# Altium footprint library con-samtec.PCBLIB: 805 footprints (part 47 of 55)
Each footprint in its own frame and in the unit in brackets; x right, y up, seen from the top. Pads: shape width x height; smd on the part's side, far side on the other; paste and mask are expansions set on the pad; w line width, h text height; cw(c..) or ccw(c..) is an arc to the next point about the centre after c.
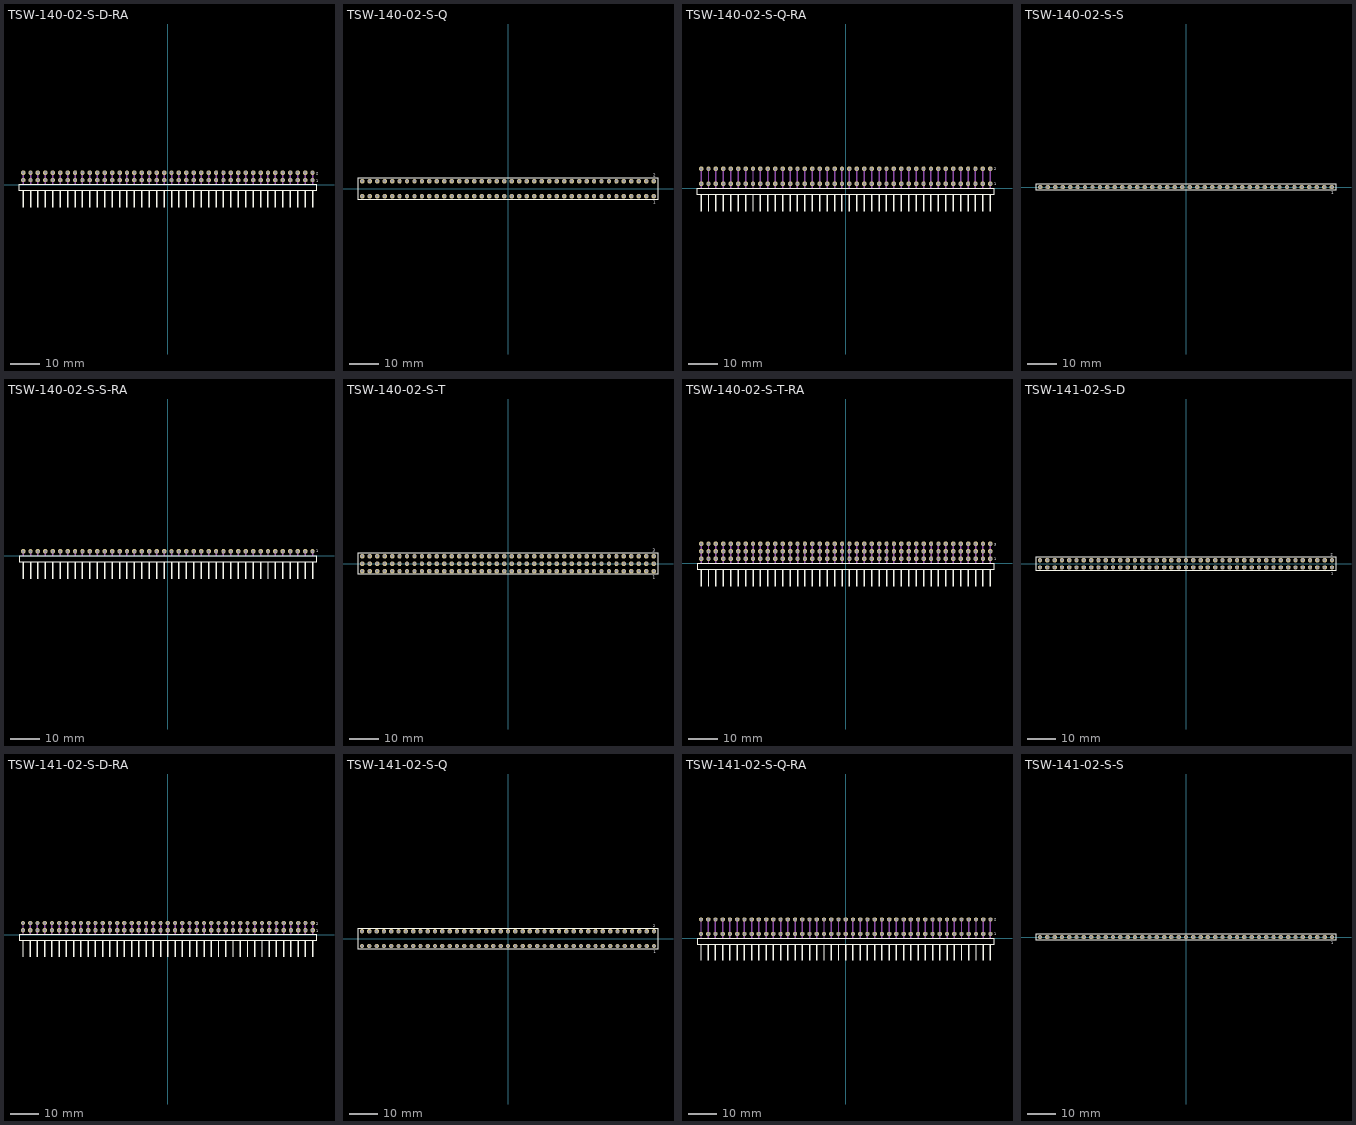
[diagram p46: the footprints below, top view; thin cyan lines are the x and y axes]

## TSW-140-02-S-D-RA [mil]
pads (80):
  oct 59.06x59.06 hole 39.37: 1(1950,60) 2(1950,160) 3(1850,60) 4(1850,160) 5(1750,60) 6(1750,160) 7(1650,60) 8(1650,160) 9(1550,60) 10(1550,160) 11(1450,60) 12(1450,160) 13(1350,60) 14(1350,160) 15(1250,60) 16(1250,160) 17(1150,60) 18(1150,160) 19(1050,60) 20(1050,160) 21(950,60) 22(950,160) 23(850,60) 24(850,160) 25(750,60) 26(750,160) 27(650,60) 28(650,160) 29(550,60) 30(550,160) 31(450,60) 32(450,160) 33(350,60) 34(350,160) 35(250,60) 36(250,160) 37(150,60) 38(150,160) 39(50,60) 40(50,160) 41(-50,60) 42(-50,160) 43(-150,60) 44(-150,160) 45(-250,60) 46(-250,160) 47(-350,60) 48(-350,160) 49(-450,60) 50(-450,160) 51(-550,60) 52(-550,160) 53(-650,60) 54(-650,160) 55(-750,60) 56(-750,160) 57(-850,60) 58(-850,160) 59(-950,60) 60(-950,160) 61(-1050,60) 62(-1050,160) 63(-1150,60) 64(-1150,160) 65(-1250,60) 66(-1250,160) 67(-1350,60) 68(-1350,160) 69(-1450,60) 70(-1450,160) 71(-1550,60) 72(-1550,160) 73(-1650,60) 74(-1650,160) 75(-1750,60) 76(-1750,160) 77(-1850,60) 78(-1850,160) 79(-1950,60) 80(-1950,160)
Top Overlay:
  rectangle: -1960,-310.63 -1940,-80.32
  rectangle: -1860,-310.63 -1840,-80.32
  rectangle: -1760,-310.63 -1740,-80.32
  rectangle: -1660,-310.63 -1640,-80.32
  rectangle: -1560,-310.63 -1540,-80.32
  rectangle: -1460,-310.63 -1440,-80.32
  rectangle: -1360,-310.63 -1340,-80.32
  rectangle: -1260,-310.63 -1240,-80.32
  rectangle: -1160,-310.63 -1140,-80.32
  rectangle: -1060,-310.63 -1040,-80.32
  rectangle: -960,-310.63 -940,-80.32
  rectangle: -860,-310.63 -840,-80.32
  rectangle: -760,-310.63 -740,-80.32
  rectangle: -660,-310.63 -640,-80.32
  rectangle: -560,-310.63 -540,-80.32
  rectangle: -460,-310.63 -440,-80.32
  rectangle: -360,-310.63 -340,-80.32
  rectangle: -260,-310.63 -240,-80.32
  rectangle: -160,-310.63 -140,-80.32
  rectangle: -60,-310.63 -40,-80.32
  rectangle: 40,-310.63 60,-80.32
  rectangle: 140,-310.63 160,-80.32
  rectangle: 240,-310.63 260,-80.32
  rectangle: 340,-310.63 360,-80.32
  rectangle: 440,-310.63 460,-80.32
  rectangle: 540,-310.63 560,-80.32
  rectangle: 640,-310.63 660,-80.32
  rectangle: 740,-310.63 760,-80.32
  rectangle: 840,-310.63 860,-80.32
  rectangle: 940,-310.63 960,-80.32
  rectangle: 1040,-310.63 1060,-80.32
  rectangle: 1140,-310.63 1160,-80.32
  rectangle: 1240,-310.63 1260,-80.32
  rectangle: 1340,-310.63 1360,-80.32
  rectangle: 1440,-310.63 1460,-80.32
  rectangle: 1540,-310.63 1560,-80.32
  rectangle: 1640,-310.63 1660,-80.32
  rectangle: 1740,-310.63 1760,-80.32
  rectangle: 1840,-310.63 1860,-80.32
  rectangle: 1940,-310.63 1960,-80.32
  lines w8: -2005.08,-80.55 2005.08,-80.55 2005.08,-4.17 -2005.08,-4.17 -2005.08,-80.55
  text "1" at 2000.59,30.51 h36.81
  text "2" at 1999.21,129.53 h36.81
Mechanical 16:
  rectangle: -1960,0 -1940,170
  rectangle: -1860,0 -1840,170
  rectangle: -1760,0 -1740,170
  rectangle: -1660,0 -1640,170
  rectangle: -1560,0 -1540,170
  rectangle: -1460,0 -1440,170
  rectangle: -1360,0 -1340,170
  rectangle: -1260,0 -1240,170
  rectangle: -1160,0 -1140,170
  rectangle: -1060,0 -1040,170
  rectangle: -960,0 -940,170
  rectangle: -860,0 -840,170
  rectangle: -760,0 -740,170
  rectangle: -660,0 -640,170
  rectangle: -560,0 -540,170
  rectangle: -460,0 -440,170
  rectangle: -360,0 -340,170
  rectangle: -260,0 -240,170
  rectangle: -160,0 -140,170
  rectangle: -60,0 -40,170
  rectangle: 40,0 60,170
  rectangle: 140,0 160,170
  rectangle: 240,0 260,170
  rectangle: 340,0 360,170
  rectangle: 440,0 460,170
  rectangle: 540,0 560,170
  rectangle: 640,0 660,170
  rectangle: 740,0 760,170
  rectangle: 840,0 860,170
  rectangle: 940,0 960,170
  rectangle: 1040,0 1060,170
  rectangle: 1140,0 1160,170
  rectangle: 1240,0 1260,170
  rectangle: 1340,0 1360,170
  rectangle: 1440,0 1460,170
  rectangle: 1540,0 1560,170
  rectangle: 1640,0 1660,170
  rectangle: 1740,0 1760,170
  rectangle: 1840,0 1860,170
  rectangle: 1940,0 1960,170

## TSW-140-02-S-Q [mm]
pads (80):
  oct 1.5x1.5 hole 1: 1(49.53,-2.54) 2(49.53,2.54) 3(46.99,-2.54) 4(46.99,2.54) 5(44.45,-2.54) 6(44.45,2.54) 7(41.91,-2.54) 8(41.91,2.54) 9(39.37,-2.54) 10(39.37,2.54) 11(36.83,-2.54) 12(36.83,2.54) 13(34.29,-2.54) 14(34.29,2.54) 15(31.75,-2.54) 16(31.75,2.54) 17(29.21,-2.54) 18(29.21,2.54) 19(26.67,-2.54) 20(26.67,2.54) 21(24.13,-2.54) 22(24.13,2.54) 23(21.59,-2.54) 24(21.59,2.54) 25(19.05,-2.54) 26(19.05,2.54) 27(16.51,-2.54) 28(16.51,2.54) 29(13.97,-2.54) 30(13.97,2.54) 31(11.43,-2.54) 32(11.43,2.54) 33(8.89,-2.54) 34(8.89,2.54) 35(6.35,-2.54) 36(6.35,2.54) 37(3.81,-2.54) 38(3.81,2.54) 39(1.27,-2.54) 40(1.27,2.54) 41(-1.27,-2.54) 42(-1.27,2.54) 43(-3.81,-2.54) 44(-3.81,2.54) 45(-6.35,-2.54) 46(-6.35,2.54) 47(-8.89,-2.54) 48(-8.89,2.54) 49(-11.43,-2.54) 50(-11.43,2.54) 51(-13.97,-2.54) 52(-13.97,2.54) 53(-16.51,-2.54) 54(-16.51,2.54) 55(-19.05,-2.54) 56(-19.05,2.54) 57(-21.59,-2.54) 58(-21.59,2.54) 59(-24.13,-2.54) 60(-24.13,2.54) 61(-26.67,-2.54) 62(-26.67,2.54) 63(-29.21,-2.54) 64(-29.21,2.54) 65(-31.75,-2.54) 66(-31.75,2.54) 67(-34.29,-2.54) 68(-34.29,2.54) 69(-36.83,-2.54) 70(-36.83,2.54) 71(-39.37,-2.54) 72(-39.37,2.54) 73(-41.91,-2.54) 74(-41.91,2.54) 75(-44.45,-2.54) 76(-44.45,2.54) 77(-46.99,-2.54) 78(-46.99,2.54) 79(-49.53,-2.54) 80(-49.53,2.54)
Top Overlay:
  lines w0.203: -50.929,-3.695 50.929,-3.695 50.929,3.695 -50.929,3.695 -50.929,-3.695
  text "1" at 49.372,-5.138 h0.94
  text "2" at 49.272,3.989 h0.94
Mechanical 16:
  rectangle: -49.88,-2.89 -49.18,-2.19
  rectangle: -49.88,2.19 -49.18,2.89
  rectangle: -47.34,-2.89 -46.64,-2.19
  rectangle: -47.34,2.19 -46.64,2.89
  rectangle: -44.8,-2.89 -44.1,-2.19
  rectangle: -44.8,2.19 -44.1,2.89
  rectangle: -42.26,-2.89 -41.56,-2.19
  rectangle: -42.26,2.19 -41.56,2.89
  rectangle: -39.72,-2.89 -39.02,-2.19
  rectangle: -39.72,2.19 -39.02,2.89
  rectangle: -37.18,-2.89 -36.48,-2.19
  rectangle: -37.18,2.19 -36.48,2.89
  rectangle: -34.64,-2.89 -33.94,-2.19
  rectangle: -34.64,2.19 -33.94,2.89
  rectangle: -32.1,-2.89 -31.4,-2.19
  rectangle: -32.1,2.19 -31.4,2.89
  rectangle: -29.56,-2.89 -28.86,-2.19
  rectangle: -29.56,2.19 -28.86,2.89
  rectangle: -27.02,-2.89 -26.32,-2.19
  rectangle: -27.02,2.19 -26.32,2.89
  rectangle: -24.48,-2.89 -23.78,-2.19
  rectangle: -24.48,2.19 -23.78,2.89
  rectangle: -21.94,-2.89 -21.24,-2.19
  rectangle: -21.94,2.19 -21.24,2.89
  rectangle: -19.4,-2.89 -18.7,-2.19
  rectangle: -19.4,2.19 -18.7,2.89
  rectangle: -16.86,-2.89 -16.16,-2.19
  rectangle: -16.86,2.19 -16.16,2.89
  rectangle: -14.32,-2.89 -13.62,-2.19
  rectangle: -14.32,2.19 -13.62,2.89
  rectangle: -11.78,-2.89 -11.08,-2.19
  rectangle: -11.78,2.19 -11.08,2.89
  rectangle: -9.24,-2.89 -8.54,-2.19
  rectangle: -9.24,2.19 -8.54,2.89
  rectangle: -6.7,-2.89 -6,-2.19
  rectangle: -6.7,2.19 -6,2.89
  rectangle: -4.16,-2.89 -3.46,-2.19
  rectangle: -4.16,2.19 -3.46,2.89
  rectangle: -1.62,-2.89 -0.92,-2.19
  rectangle: -1.62,2.19 -0.92,2.89
  rectangle: 0.92,-2.89 1.62,-2.19
  rectangle: 0.92,2.19 1.62,2.89
  rectangle: 3.46,-2.89 4.16,-2.19
  rectangle: 3.46,2.19 4.16,2.89
  rectangle: 6,-2.89 6.7,-2.19
  rectangle: 6,2.19 6.7,2.89
  rectangle: 8.54,-2.89 9.24,-2.19
  rectangle: 8.54,2.19 9.24,2.89
  rectangle: 11.08,-2.89 11.78,-2.19
  rectangle: 11.08,2.19 11.78,2.89
  rectangle: 13.62,-2.89 14.32,-2.19
  rectangle: 13.62,2.19 14.32,2.89
  rectangle: 16.16,-2.89 16.86,-2.19
  rectangle: 16.16,2.19 16.86,2.89
  rectangle: 18.7,-2.89 19.4,-2.19
  rectangle: 18.7,2.19 19.4,2.89
  rectangle: 21.24,-2.89 21.94,-2.19
  rectangle: 21.24,2.19 21.94,2.89
  rectangle: 23.78,-2.89 24.48,-2.19
  rectangle: 23.78,2.19 24.48,2.89
  rectangle: 26.32,-2.89 27.02,-2.19
  rectangle: 26.32,2.19 27.02,2.89
  rectangle: 28.86,-2.89 29.56,-2.19
  rectangle: 28.86,2.19 29.56,2.89
  rectangle: 31.4,-2.89 32.1,-2.19
  rectangle: 31.4,2.19 32.1,2.89
  rectangle: 33.94,-2.89 34.64,-2.19
  rectangle: 33.94,2.19 34.64,2.89
  rectangle: 36.48,-2.89 37.18,-2.19
  rectangle: 36.48,2.19 37.18,2.89
  rectangle: 39.02,-2.89 39.72,-2.19
  rectangle: 39.02,2.19 39.72,2.89
  rectangle: 41.56,-2.89 42.26,-2.19
  rectangle: 41.56,2.19 42.26,2.89
  rectangle: 44.1,-2.89 44.8,-2.19
  rectangle: 44.1,2.19 44.8,2.89
  rectangle: 46.64,-2.89 47.34,-2.19
  rectangle: 46.64,2.19 47.34,2.89
  rectangle: 49.18,-2.89 49.88,-2.19
  rectangle: 49.18,2.19 49.88,2.89

## TSW-140-02-S-Q-RA [mil]
pads (80):
  oct 59.06x59.06 hole 39.37: 1(1950,60) 2(1950,260) 3(1850,60) 4(1850,260) 5(1750,60) 6(1750,260) 7(1650,60) 8(1650,260) 9(1550,60) 10(1550,260) 11(1450,60) 12(1450,260) 13(1350,60) 14(1350,260) 15(1250,60) 16(1250,260) 17(1150,60) 18(1150,260) 19(1050,60) 20(1050,260) 21(950,60) 22(950,260) 23(850,60) 24(850,260) 25(750,60) 26(750,260) 27(650,60) 28(650,260) 29(550,60) 30(550,260) 31(450,60) 32(450,260) 33(350,60) 34(350,260) 35(250,60) 36(250,260) 37(150,60) 38(150,260) 39(50,60) 40(50,260) 41(-50,60) 42(-50,260) 43(-150,60) 44(-150,260) 45(-250,60) 46(-250,260) 47(-350,60) 48(-350,260) 49(-450,60) 50(-450,260) 51(-550,60) 52(-550,260) 53(-650,60) 54(-650,260) 55(-750,60) 56(-750,260) 57(-850,60) 58(-850,260) 59(-950,60) 60(-950,260) 61(-1050,60) 62(-1050,260) 63(-1150,60) 64(-1150,260) 65(-1250,60) 66(-1250,260) 67(-1350,60) 68(-1350,260) 69(-1450,60) 70(-1450,260) 71(-1550,60) 72(-1550,260) 73(-1650,60) 74(-1650,260) 75(-1750,60) 76(-1750,260) 77(-1850,60) 78(-1850,260) 79(-1950,60) 80(-1950,260)
Top Overlay:
  rectangle: -1960,-310.63 -1940,-80.32
  rectangle: -1860,-310.63 -1840,-80.32
  rectangle: -1760,-310.63 -1740,-80.32
  rectangle: -1660,-310.63 -1640,-80.32
  rectangle: -1560,-310.63 -1540,-80.32
  rectangle: -1460,-310.63 -1440,-80.32
  rectangle: -1360,-310.63 -1340,-80.32
  rectangle: -1260,-310.63 -1240,-80.32
  rectangle: -1160,-310.63 -1140,-80.32
  rectangle: -1060,-310.63 -1040,-80.32
  rectangle: -960,-310.63 -940,-80.32
  rectangle: -860,-310.63 -840,-80.32
  rectangle: -760,-310.63 -740,-80.32
  rectangle: -660,-310.63 -640,-80.32
  rectangle: -560,-310.63 -540,-80.32
  rectangle: -460,-310.63 -440,-80.32
  rectangle: -360,-310.63 -340,-80.32
  rectangle: -260,-310.63 -240,-80.32
  rectangle: -160,-310.63 -140,-80.32
  rectangle: -60,-310.63 -40,-80.32
  rectangle: 40,-310.63 60,-80.32
  rectangle: 140,-310.63 160,-80.32
  rectangle: 240,-310.63 260,-80.32
  rectangle: 340,-310.63 360,-80.32
  rectangle: 440,-310.63 460,-80.32
  rectangle: 540,-310.63 560,-80.32
  rectangle: 640,-310.63 660,-80.32
  rectangle: 740,-310.63 760,-80.32
  rectangle: 840,-310.63 860,-80.32
  rectangle: 940,-310.63 960,-80.32
  rectangle: 1040,-310.63 1060,-80.32
  rectangle: 1140,-310.63 1160,-80.32
  rectangle: 1240,-310.63 1260,-80.32
  rectangle: 1340,-310.63 1360,-80.32
  rectangle: 1440,-310.63 1460,-80.32
  rectangle: 1540,-310.63 1560,-80.32
  rectangle: 1640,-310.63 1660,-80.32
  rectangle: 1740,-310.63 1760,-80.32
  rectangle: 1840,-310.63 1860,-80.32
  rectangle: 1940,-310.63 1960,-80.32
  lines w8: -2005.08,-80.55 2005.08,-80.55 2005.08,-4.17 -2005.08,-4.17 -2005.08,-80.55
  text "1" at 2003.54,43.31 h36.81
  text "2" at 2001.18,242.72 h36.81
Mechanical 16:
  rectangle: -1960,0 -1940,270
  rectangle: -1860,0 -1840,270
  rectangle: -1760,0 -1740,270
  rectangle: -1660,0 -1640,270
  rectangle: -1560,0 -1540,270
  rectangle: -1460,0 -1440,270
  rectangle: -1360,0 -1340,270
  rectangle: -1260,0 -1240,270
  rectangle: -1160,0 -1140,270
  rectangle: -1060,0 -1040,270
  rectangle: -960,0 -940,270
  rectangle: -860,0 -840,270
  rectangle: -760,0 -740,270
  rectangle: -660,0 -640,270
  rectangle: -560,0 -540,270
  rectangle: -460,0 -440,270
  rectangle: -360,0 -340,270
  rectangle: -260,0 -240,270
  rectangle: -160,0 -140,270
  rectangle: -60,0 -40,270
  rectangle: 40,0 60,270
  rectangle: 140,0 160,270
  rectangle: 240,0 260,270
  rectangle: 340,0 360,270
  rectangle: 440,0 460,270
  rectangle: 540,0 560,270
  rectangle: 640,0 660,270
  rectangle: 740,0 760,270
  rectangle: 840,0 860,270
  rectangle: 940,0 960,270
  rectangle: 1040,0 1060,270
  rectangle: 1140,0 1160,270
  rectangle: 1240,0 1260,270
  rectangle: 1340,0 1360,270
  rectangle: 1440,0 1460,270
  rectangle: 1540,0 1560,270
  rectangle: 1640,0 1660,270
  rectangle: 1740,0 1760,270
  rectangle: 1840,0 1860,270
  rectangle: 1940,0 1960,270

## TSW-140-02-S-S [mm]
pads (40):
  oct 1.5x1.5 hole 1: 1(49.53,0) 2(46.99,0) 3(44.45,0) 4(41.91,0) 5(39.37,0) 6(36.83,0) 7(34.29,0) 8(31.75,0) 9(29.21,0) 10(26.67,0) 11(24.13,0) 12(21.59,0) 13(19.05,0) 14(16.51,0) 15(13.97,0) 16(11.43,0) 17(8.89,0) 18(6.35,0) 19(3.81,0) 20(1.27,0) 21(-1.27,0) 22(-3.81,0) 23(-6.35,0) 24(-8.89,0) 25(-11.43,0) 26(-13.97,0) 27(-16.51,0) 28(-19.05,0) 29(-21.59,0) 30(-24.13,0) 31(-26.67,0) 32(-29.21,0) 33(-31.75,0) 34(-34.29,0) 35(-36.83,0) 36(-39.37,0) 37(-41.91,0) 38(-44.45,0) 39(-46.99,0) 40(-49.53,0)
Top Overlay:
  lines w0.203: -50.929,-1.155 50.929,-1.155 50.929,1.155 -50.929,1.155 -50.929,-1.155
  text "1" at 49.272,-2.498 h0.94
Mechanical 16:
  rectangle: -49.88,-0.35 -49.18,0.35
  rectangle: -47.34,-0.35 -46.64,0.35
  rectangle: -44.8,-0.35 -44.1,0.35
  rectangle: -42.26,-0.35 -41.56,0.35
  rectangle: -39.72,-0.35 -39.02,0.35
  rectangle: -37.18,-0.35 -36.48,0.35
  rectangle: -34.64,-0.35 -33.94,0.35
  rectangle: -32.1,-0.35 -31.4,0.35
  rectangle: -29.56,-0.35 -28.86,0.35
  rectangle: -27.02,-0.35 -26.32,0.35
  rectangle: -24.48,-0.35 -23.78,0.35
  rectangle: -21.94,-0.35 -21.24,0.35
  rectangle: -19.4,-0.35 -18.7,0.35
  rectangle: -16.86,-0.35 -16.16,0.35
  rectangle: -14.32,-0.35 -13.62,0.35
  rectangle: -11.78,-0.35 -11.08,0.35
  rectangle: -9.24,-0.35 -8.54,0.35
  rectangle: -6.7,-0.35 -6,0.35
  rectangle: -4.16,-0.35 -3.46,0.35
  rectangle: -1.62,-0.35 -0.92,0.35
  rectangle: 0.92,-0.35 1.62,0.35
  rectangle: 3.46,-0.35 4.16,0.35
  rectangle: 6,-0.35 6.7,0.35
  rectangle: 8.54,-0.35 9.24,0.35
  rectangle: 11.08,-0.35 11.78,0.35
  rectangle: 13.62,-0.35 14.32,0.35
  rectangle: 16.16,-0.35 16.86,0.35
  rectangle: 18.7,-0.35 19.4,0.35
  rectangle: 21.24,-0.35 21.94,0.35
  rectangle: 23.78,-0.35 24.48,0.35
  rectangle: 26.32,-0.35 27.02,0.35
  rectangle: 28.86,-0.35 29.56,0.35
  rectangle: 31.4,-0.35 32.1,0.35
  rectangle: 33.94,-0.35 34.64,0.35
  rectangle: 36.48,-0.35 37.18,0.35
  rectangle: 39.02,-0.35 39.72,0.35
  rectangle: 41.56,-0.35 42.26,0.35
  rectangle: 44.1,-0.35 44.8,0.35
  rectangle: 46.64,-0.35 47.34,0.35
  rectangle: 49.18,-0.35 49.88,0.35

## TSW-140-02-S-S-RA [mil]
pads (40):
  oct 59.06x59.06 hole 39.37: 1(1950,60) 2(1850,60) 3(1750,60) 4(1650,60) 5(1550,60) 6(1450,60) 7(1350,60) 8(1250,60) 9(1150,60) 10(1050,60) 11(950,60) 12(850,60) 13(750,60) 14(650,60) 15(550,60) 16(450,60) 17(350,60) 18(250,60) 19(150,60) 20(50,60) 21(-50,60) 22(-150,60) 23(-250,60) 24(-350,60) 25(-450,60) 26(-550,60) 27(-650,60) 28(-750,60) 29(-850,60) 30(-950,60) 31(-1050,60) 32(-1150,60) 33(-1250,60) 34(-1350,60) 35(-1450,60) 36(-1550,60) 37(-1650,60) 38(-1750,60) 39(-1850,60) 40(-1950,60)
Top Overlay:
  rectangle: -1960,-310.63 -1940,-80.32
  rectangle: -1860,-310.63 -1840,-80.32
  rectangle: -1760,-310.63 -1740,-80.32
  rectangle: -1660,-310.63 -1640,-80.32
  rectangle: -1560,-310.63 -1540,-80.32
  rectangle: -1460,-310.63 -1440,-80.32
  rectangle: -1360,-310.63 -1340,-80.32
  rectangle: -1260,-310.63 -1240,-80.32
  rectangle: -1160,-310.63 -1140,-80.32
  rectangle: -1060,-310.63 -1040,-80.32
  rectangle: -960,-310.63 -940,-80.32
  rectangle: -860,-310.63 -840,-80.32
  rectangle: -760,-310.63 -740,-80.32
  rectangle: -660,-310.63 -640,-80.32
  rectangle: -560,-310.63 -540,-80.32
  rectangle: -460,-310.63 -440,-80.32
  rectangle: -360,-310.63 -340,-80.32
  rectangle: -260,-310.63 -240,-80.32
  rectangle: -160,-310.63 -140,-80.32
  rectangle: -60,-310.63 -40,-80.32
  rectangle: 40,-310.63 60,-80.32
  rectangle: 140,-310.63 160,-80.32
  rectangle: 240,-310.63 260,-80.32
  rectangle: 340,-310.63 360,-80.32
  rectangle: 440,-310.63 460,-80.32
  rectangle: 540,-310.63 560,-80.32
  rectangle: 640,-310.63 660,-80.32
  rectangle: 740,-310.63 760,-80.32
  rectangle: 840,-310.63 860,-80.32
  rectangle: 940,-310.63 960,-80.32
  rectangle: 1040,-310.63 1060,-80.32
  rectangle: 1140,-310.63 1160,-80.32
  rectangle: 1240,-310.63 1260,-80.32
  rectangle: 1340,-310.63 1360,-80.32
  rectangle: 1440,-310.63 1460,-80.32
  rectangle: 1540,-310.63 1560,-80.32
  rectangle: 1640,-310.63 1660,-80.32
  rectangle: 1740,-310.63 1760,-80.32
  rectangle: 1840,-310.63 1860,-80.32
  rectangle: 1940,-310.63 1960,-80.32
  lines w8: -2005.08,-80.55 2005.08,-80.55 2005.08,-4.17 -2005.08,-4.17 -2005.08,-80.55
  text "1" at 2000.47,45.35 h36.81
Mechanical 16:
  rectangle: -1960,0 -1940,70
  rectangle: -1860,0 -1840,70
  rectangle: -1760,0 -1740,70
  rectangle: -1660,0 -1640,70
  rectangle: -1560,0 -1540,70
  rectangle: -1460,0 -1440,70
  rectangle: -1360,0 -1340,70
  rectangle: -1260,0 -1240,70
  rectangle: -1160,0 -1140,70
  rectangle: -1060,0 -1040,70
  rectangle: -960,0 -940,70
  rectangle: -860,0 -840,70
  rectangle: -760,0 -740,70
  rectangle: -660,0 -640,70
  rectangle: -560,0 -540,70
  rectangle: -460,0 -440,70
  rectangle: -360,0 -340,70
  rectangle: -260,0 -240,70
  rectangle: -160,0 -140,70
  rectangle: -60,0 -40,70
  rectangle: 40,0 60,70
  rectangle: 140,0 160,70
  rectangle: 240,0 260,70
  rectangle: 340,0 360,70
  rectangle: 440,0 460,70
  rectangle: 540,0 560,70
  rectangle: 640,0 660,70
  rectangle: 740,0 760,70
  rectangle: 840,0 860,70
  rectangle: 940,0 960,70
  rectangle: 1040,0 1060,70
  rectangle: 1140,0 1160,70
  rectangle: 1240,0 1260,70
  rectangle: 1340,0 1360,70
  rectangle: 1440,0 1460,70
  rectangle: 1540,0 1560,70
  rectangle: 1640,0 1660,70
  rectangle: 1740,0 1760,70
  rectangle: 1840,0 1860,70
  rectangle: 1940,0 1960,70

## TSW-140-02-S-T [mm]
pads (120):
  oct 1.5x1.5 hole 1: 1(49.53,-2.54) 2(49.53,0) 3(49.53,2.54) 4(46.99,-2.54) 5(46.99,0) 6(46.99,2.54) 7(44.45,-2.54) 8(44.45,0) 9(44.45,2.54) 10(41.91,-2.54) 11(41.91,0) 12(41.91,2.54) 13(39.37,-2.54) 14(39.37,0) 15(39.37,2.54) 16(36.83,-2.54) 17(36.83,0) 18(36.83,2.54) 19(34.29,-2.54) 20(34.29,0) 21(34.29,2.54) 22(31.75,-2.54) 23(31.75,0) 24(31.75,2.54) 25(29.21,-2.54) 26(29.21,0) 27(29.21,2.54) 28(26.67,-2.54) 29(26.67,0) 30(26.67,2.54) 31(24.13,-2.54) 32(24.13,0) 33(24.13,2.54) 34(21.59,-2.54) 35(21.59,0) 36(21.59,2.54) 37(19.05,-2.54) 38(19.05,0) 39(19.05,2.54) 40(16.51,-2.54) 41(16.51,0) 42(16.51,2.54) 43(13.97,-2.54) 44(13.97,0) 45(13.97,2.54) 46(11.43,-2.54) 47(11.43,0) 48(11.43,2.54) 49(8.89,-2.54) 50(8.89,0) 51(8.89,2.54) 52(6.35,-2.54) 53(6.35,0) 54(6.35,2.54) 55(3.81,-2.54) 56(3.81,0) 57(3.81,2.54) 58(1.27,-2.54) 59(1.27,0) 60(1.27,2.54) 61(-1.27,-2.54) 62(-1.27,0) 63(-1.27,2.54) 64(-3.81,-2.54) 65(-3.81,0) 66(-3.81,2.54) 67(-6.35,-2.54) 68(-6.35,0) 69(-6.35,2.54) 70(-8.89,-2.54) 71(-8.89,0) 72(-8.89,2.54) 73(-11.43,-2.54) 74(-11.43,0) 75(-11.43,2.54) 76(-13.97,-2.54) 77(-13.97,0) 78(-13.97,2.54) 79(-16.51,-2.54) 80(-16.51,0) 81(-16.51,2.54) 82(-19.05,-2.54) 83(-19.05,0) 84(-19.05,2.54) 85(-21.59,-2.54) 86(-21.59,0) 87(-21.59,2.54) 88(-24.13,-2.54) 89(-24.13,0) 90(-24.13,2.54) 91(-26.67,-2.54) 92(-26.67,0) 93(-26.67,2.54) 94(-29.21,-2.54) 95(-29.21,0) 96(-29.21,2.54) 97(-31.75,-2.54) 98(-31.75,0) 99(-31.75,2.54) 100(-34.29,-2.54) 101(-34.29,0) 102(-34.29,2.54) 103(-36.83,-2.54) 104(-36.83,0) 105(-36.83,2.54) 106(-39.37,-2.54) 107(-39.37,0) 108(-39.37,2.54) 109(-41.91,-2.54) 110(-41.91,0) 111(-41.91,2.54) 112(-44.45,-2.54) 113(-44.45,0) 114(-44.45,2.54) 115(-46.99,-2.54) 116(-46.99,0) 117(-46.99,2.54) 118(-49.53,-2.54) 119(-49.53,0) 120(-49.53,2.54)
Top Overlay:
  lines w0.203: -50.929,-3.695 50.929,-3.695 50.929,3.695 -50.929,3.695 -50.929,-3.695
  text "1" at 49.222,-5.188 h0.94
  text "3" at 49.218,3.989 h0.94
Mechanical 16:
  rectangle: -49.88,-2.89 -49.18,-2.19
  rectangle: -49.88,-0.35 -49.18,0.35
  rectangle: -49.88,2.19 -49.18,2.89
  rectangle: -47.34,-2.89 -46.64,-2.19
  rectangle: -47.34,-0.35 -46.64,0.35
  rectangle: -47.34,2.19 -46.64,2.89
  rectangle: -44.8,-2.89 -44.1,-2.19
  rectangle: -44.8,-0.35 -44.1,0.35
  rectangle: -44.8,2.19 -44.1,2.89
  rectangle: -42.26,-2.89 -41.56,-2.19
  rectangle: -42.26,-0.35 -41.56,0.35
  rectangle: -42.26,2.19 -41.56,2.89
  rectangle: -39.72,-2.89 -39.02,-2.19
  rectangle: -39.72,-0.35 -39.02,0.35
  rectangle: -39.72,2.19 -39.02,2.89
  rectangle: -37.18,-2.89 -36.48,-2.19
  rectangle: -37.18,-0.35 -36.48,0.35
  rectangle: -37.18,2.19 -36.48,2.89
  rectangle: -34.64,-2.89 -33.94,-2.19
  rectangle: -34.64,-0.35 -33.94,0.35
  rectangle: -34.64,2.19 -33.94,2.89
  rectangle: -32.1,-2.89 -31.4,-2.19
  rectangle: -32.1,-0.35 -31.4,0.35
  rectangle: -32.1,2.19 -31.4,2.89
  rectangle: -29.56,-2.89 -28.86,-2.19
  rectangle: -29.56,-0.35 -28.86,0.35
  rectangle: -29.56,2.19 -28.86,2.89
  rectangle: -27.02,-2.89 -26.32,-2.19
  rectangle: -27.02,-0.35 -26.32,0.35
  rectangle: -27.02,2.19 -26.32,2.89
  rectangle: -24.48,-2.89 -23.78,-2.19
  rectangle: -24.48,-0.35 -23.78,0.35
  rectangle: -24.48,2.19 -23.78,2.89
  rectangle: -21.94,-2.89 -21.24,-2.19
  rectangle: -21.94,-0.35 -21.24,0.35
  rectangle: -21.94,2.19 -21.24,2.89
  rectangle: -19.4,-2.89 -18.7,-2.19
  rectangle: -19.4,-0.35 -18.7,0.35
  rectangle: -19.4,2.19 -18.7,2.89
  rectangle: -16.86,-2.89 -16.16,-2.19
  rectangle: -16.86,-0.35 -16.16,0.35
  rectangle: -16.86,2.19 -16.16,2.89
  rectangle: -14.32,-2.89 -13.62,-2.19
  rectangle: -14.32,-0.35 -13.62,0.35
  rectangle: -14.32,2.19 -13.62,2.89
  rectangle: -11.78,-2.89 -11.08,-2.19
  rectangle: -11.78,-0.35 -11.08,0.35
  rectangle: -11.78,2.19 -11.08,2.89
  rectangle: -9.24,-2.89 -8.54,-2.19
  rectangle: -9.24,-0.35 -8.54,0.35
  rectangle: -9.24,2.19 -8.54,2.89
  rectangle: -6.7,-2.89 -6,-2.19
  rectangle: -6.7,-0.35 -6,0.35
  rectangle: -6.7,2.19 -6,2.89
  rectangle: -4.16,-2.89 -3.46,-2.19
  rectangle: -4.16,-0.35 -3.46,0.35
  rectangle: -4.16,2.19 -3.46,2.89
  rectangle: -1.62,-2.89 -0.92,-2.19
  rectangle: -1.62,-0.35 -0.92,0.35
  rectangle: -1.62,2.19 -0.92,2.89
  rectangle: 0.92,-2.89 1.62,-2.19
  rectangle: 0.92,-0.35 1.62,0.35
  rectangle: 0.92,2.19 1.62,2.89
  rectangle: 3.46,-2.89 4.16,-2.19
  rectangle: 3.46,-0.35 4.16,0.35